# Altium footprint library Molex.PcbLib: 45 footprints (part 3 of 3)
Each footprint in its own frame and in the unit in brackets; x right, y up, seen from the top. Pads: shape width x height; smd on the part's side, far side on the other; paste and mask are expansions set on the pad; w line width, h text height; cw(c..) or ccw(c..) is an arc to the next point about the centre after c.
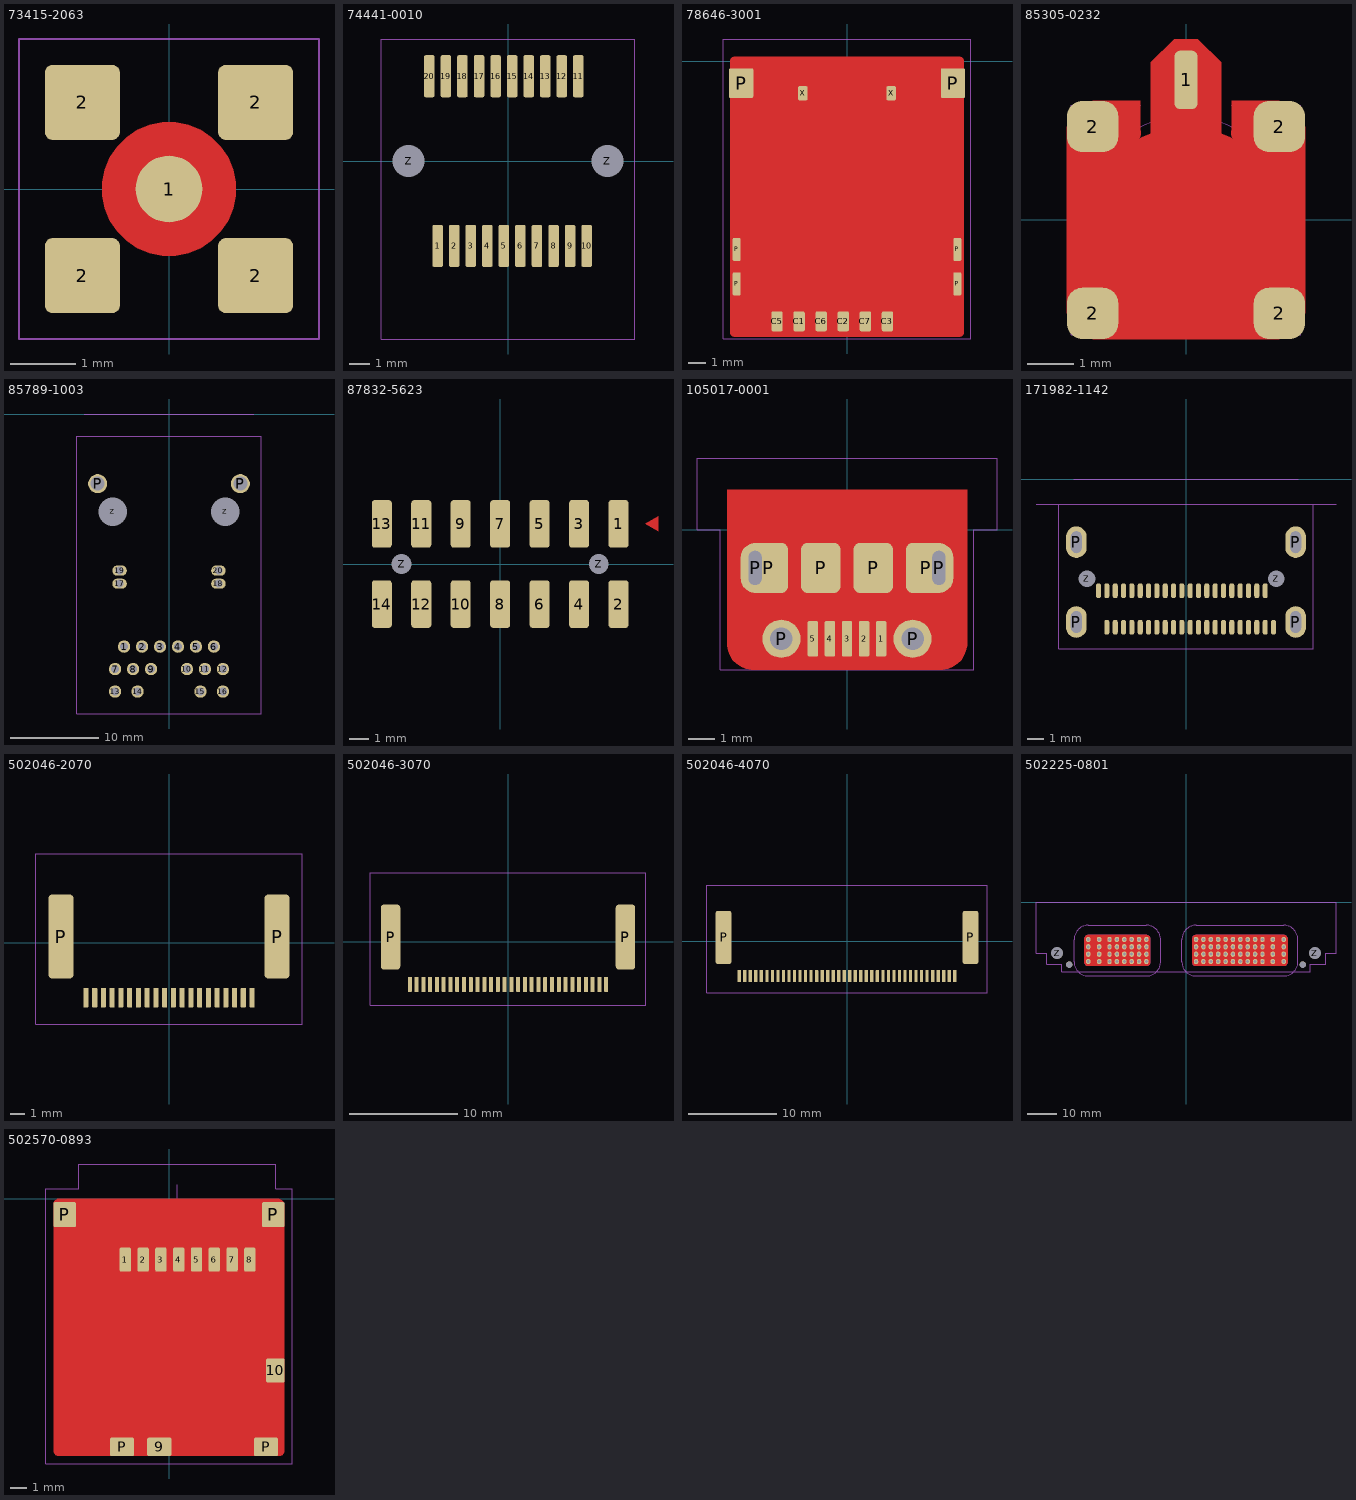
[diagram p2: the footprints below, top view; thin cyan lines are the x and y axes]

## 73415-2063 [mil]
pads (5):
  round 40 smd paste-1 mask+2: 1(0,0)
  rrect20% 45x45 smd paste-1 mask+2: 2(-52,-52) 2(-52,52) 2(52,-52) 2(52,52)
Top Layer:
  pour cut-out: 0,40 -3.94,40 -11.67,38.46 -18.95,35.45 -25.5,31.07 -31.07,25.5 -35.45,18.95 -38.46,11.67 -40,3.94 -40,0 -40,-3.94 -38.46,-11.67 -35.45,-18.95 -31.07,-25.5 -25.5,-31.07 -18.95,-35.45 -11.67,-38.46 -3.94,-40 0,-40 3.94,-40 11.67,-38.46 18.95,-35.45 25.5,-31.07 31.07,-25.5 35.45,-18.95 38.46,-11.67 40,-3.94 40,0 40,3.94 38.46,11.67 35.45,18.95 31.07,25.5 25.5,31.07 18.95,35.45 11.67,38.46 3.94,40
Top Component Outline:
  lines w1: -90,-90 -90,90 90,90 90,-90 -90,-90
Top 3D Body (Mech16):
  lines w1: -68,-68 -36,-68 -36,-36 -68,-36 -68,-68 ; -68,36 -68,68 -36,68 -36,36 -68,36 ; 36,-68 36,-36 68,-36 68,-68 36,-68 ; 36,36 36,68 68,68 68,36 36,36
3D body "MMCX.step": height 196.84, standoff -0.01, extent -68.89,-68.89 68.9,68.9

## 74441-0010 [mm] "SFP"
pads (22):
  rrect30% 0.508x2.032 smd paste+0 mask+0.051: 1(-3.4,-4.1) 2(-2.6,-4.1) 3(-1.8,-4.1) 4(-1,-4.1) 5(-0.2,-4.1) 6(0.6,-4.1) 7(1.4,-4.1) 8(2.2,-4.1) 9(3,-4.1) 10(3.8,-4.1) 11(3.4,4.1) 12(2.6,4.1) 13(1.8,4.1) 14(1,4.1) 15(0.2,4.1) 16(-0.6,4.1) 17(-1.4,4.1) 18(-2.2,4.1) 19(-3,4.1) 20(-3.8,4.1)
  round 0.635 hole 1.55 unplated mask+0.508: Z(-4.8,0) Z(4.8,0)
Top Component Outline:
  lines w0.025: -6.13,-8.6 6.13,-8.6 6.13,5.9 -6.13,5.9 -6.13,-8.6
Multi-Layer:
  pour cut-out: 4.8,1.016 4.9,1.016 5.096,0.977 5.281,0.9 5.448,0.789 5.589,0.648 5.7,0.481 5.777,0.296 5.816,0.1 5.816,0 5.816,-0.1 5.777,-0.296 5.7,-0.481 5.589,-0.648 5.448,-0.789 5.281,-0.9 5.096,-0.977 4.9,-1.016 4.8,-1.016 4.7,-1.016 4.504,-0.977 4.319,-0.9 4.152,-0.789 4.011,-0.648 3.9,-0.481 3.823,-0.296 3.784,-0.1 3.784,0 3.784,0.1 3.823,0.296 3.9,0.481 4.011,0.648 4.152,0.789 4.319,0.9 4.504,0.977 4.7,1.016
  pour cut-out: -4.8,1.016 -4.7,1.016 -4.504,0.977 -4.319,0.9 -4.152,0.789 -4.011,0.648 -3.9,0.481 -3.823,0.296 -3.784,0.1 -3.784,0 -3.784,-0.1 -3.823,-0.296 -3.9,-0.481 -4.011,-0.648 -4.152,-0.789 -4.319,-0.9 -4.504,-0.977 -4.7,-1.016 -4.8,-1.016 -4.9,-1.016 -5.096,-0.977 -5.281,-0.9 -5.448,-0.789 -5.589,-0.648 -5.7,-0.481 -5.777,-0.296 -5.816,-0.1 -5.816,0 -5.816,0.1 -5.777,0.296 -5.7,0.481 -5.589,0.648 -5.448,0.789 -5.281,0.9 -5.096,0.977 -4.9,1.016
3D body "744410010.stp": height 5.37, standoff -0.9, extent -5.5,-4.575 5.5,4.575

## 78646-3001 [mil]
pads (14):
  rrect30% 25.59x45.28 smd mask+2: C1(-108.46,-590) C2(-8.46,-590) C3(91.54,-590) C5(-158.46,-590) C6(-58.46,-590) C7(41.54,-590)
  rrect30% 18x52 smd mask+2: P(-250,-505) P(-250,-427) P(250,-505) P(250,-427)
  rrect10% 55x67 smd mask+2: P(-240,-50) P(240,-50)
  rrect30% 22x32 smd mask+2: X(-100,-73) X(100,-73)
Top Layer:
  pour cut-out: -255,10 -256.99,10 -260.66,8.48 -263.48,5.66 -265,1.99 -265,0 -265,-615 -265,-616.99 -263.48,-620.66 -260.66,-623.48 -256.99,-625 -255,-625 255,-625 256.99,-625 260.66,-623.48 263.48,-620.66 265,-616.99 265,-615 265,0 265,1.99 263.48,5.66 260.66,8.48 256.99,10 255,10
Top Component Outline:
  lines w1: -280,-630 280,-630 280,50 -280,50 -280,-630
3D body "78646-3001.stp": height 56.26, standoff -0.83, extent -256.89,-608.27 256.89,0

## 85305-0232 [mil]
pads (5):
  rrect50% 20x50 smd paste-1 mask+2: 1(0,120)
  rrect60% 44x44 smd paste-2 mask+2: 2(-80,-80) 2(-80,80) 2(80,-80) 2(80,80)
Top Layer:
  pour cut-out: -30,70 -30,135 -10,155 10,155 30,135 30,70
  pour cut-out: 0,-80 -7.88,-80 -23.34,-76.93 -37.89,-70.89 -51,-62.14 -62.14,-51 -70.89,-37.89 -76.93,-23.34 -80,-7.88 -80,0 -80,7.88 -76.93,23.34 -70.89,37.89 -62.14,51 -51,62.14 -37.89,70.89 -23.34,76.93 -7.88,80 0,80 7.88,80 23.34,76.93 37.89,70.89 51,62.14 62.14,51 70.89,37.89 76.93,23.34 80,7.88 80,0 80,-7.88 76.93,-23.34 70.89,-37.89 62.14,-51 51,-62.14 37.89,-70.89 23.34,-76.93 7.88,-80
  region: -80,102 -102,80 -102,-80 -80,-102 80,-102 102,-80 102,80 80,102 39,102 39,74 85,33 85,-35 35,-85 -38,-85 -85,-38 -85,33 -39,73 -39,102
  lines w19.68: -48.25,74.29 ccw(c0,0) 48.25,74.29
Top 3D Body (Mech16):
  circle w1: c0,0 r88.58
  lines w1: -39.37,98.43 -98.43,98.43 -98.43,-98.43 98.43,-98.43 98.43,98.43 39.37,98.43
3D body "853050232.stp": height 160, standoff -1.42, extent -98.42,-98.42 98.44,137.77

## 85789-1003 [mil] "POE RJ45"
pads (24):
  round 55 hole 35: 1(-200,-1035) 2(-120,-1035) 3(-40,-1035) 4(40,-1035) 5(120,-1035) 6(200,-1035) 7(-240,-1135) 8(-160,-1135) 9(-80,-1135) 10(80,-1135) 11(160,-1135) 12(240,-1135) 13(-240,-1235) 14(-140,-1235) 15(140,-1235) 16(240,-1235)
  oval 65x45 hole 35: 17(-220,-755) 18(220,-755) 19(-220,-697) 20(220,-697)
  round 85 hole 62: P(-317.5,-310) P(317.5,-310)
  round 39.37 hole 126 unplated mask+48: Z(-250,-435) Z(250,-435)
Top Component Outline:
  lines w1: -410,-1335 410,-1335 410,-100 -410,-100 -410,-1335
Top 3D Body (Mech16):
  lines w1: -377.69,0 377.69,0
Multi-Layer:
  pour cut-out: 250,-510 242.61,-510 228.12,-507.12 214.47,-501.46 202.19,-493.26 191.74,-482.81 183.54,-470.53 177.88,-456.88 175,-442.39 175,-435 175,-427.61 177.88,-413.12 183.54,-399.47 191.74,-387.19 202.19,-376.74 214.47,-368.54 228.12,-362.88 242.61,-360 250,-360 257.39,-360 271.88,-362.88 285.53,-368.54 297.81,-376.74 308.26,-387.19 316.46,-399.47 322.12,-413.12 325,-427.61 325,-435 325,-442.39 322.12,-456.88 316.46,-470.53 308.26,-482.81 297.81,-493.26 285.53,-501.46 271.88,-507.12 257.39,-510
  pour cut-out: -250,-510 -257.39,-510 -271.88,-507.12 -285.53,-501.46 -297.81,-493.26 -308.26,-482.81 -316.46,-470.53 -322.12,-456.88 -325,-442.39 -325,-435 -325,-427.61 -322.12,-413.12 -316.46,-399.47 -308.26,-387.19 -297.81,-376.74 -285.53,-368.54 -271.88,-362.88 -257.39,-360 -250,-360 -242.61,-360 -228.12,-362.88 -214.47,-368.54 -202.19,-376.74 -191.74,-387.19 -183.54,-399.47 -177.88,-413.12 -175,-427.61 -175,-435 -175,-442.39 -177.88,-456.88 -183.54,-470.53 -191.74,-482.81 -202.19,-493.26 -214.47,-501.46 -228.12,-507.12 -242.61,-510
3D body "MOLEX-SD-85789-1006.stp": height 593.98, standoff -144.06, extent -377.69,-1299.61 377.7,0

## 87832-5623 [mil]
pads (16):
  rrect30% 40x95 smd: 1(236.22,80) 2(236.22,-80) 3(157.48,80) 4(157.48,-80) 5(78.74,80) 6(78.74,-80) 7(0,80) 8(0,-80) 9(-78.74,80) 10(-78.74,-80) 11(-157.48,80) 12(-157.48,-80) 13(-236.22,80) 14(-236.22,-80)
  round 27 hole 39.37 unplated mask+10: Z(-196.85,0) Z(196.85,0)
Top Layer:
  region: 290,80 315,65 315,95
Multi-Layer:
  pour cut-out: 196.85,30 193.9,30 188.1,28.85 182.64,26.59 177.73,23.3 173.55,19.12 170.26,14.21 168,8.75 166.85,2.95 166.85,0 166.85,-2.95 168,-8.75 170.27,-14.21 173.55,-19.12 177.73,-23.3 182.64,-26.58 188.1,-28.85 193.9,-30 196.85,-30 199.81,-30 205.6,-28.85 211.06,-26.58 215.97,-23.3 220.15,-19.12 223.44,-14.21 225.7,-8.75 226.85,-2.95 226.85,0 226.85,2.95 225.7,8.75 223.44,14.21 220.15,19.12 215.97,23.3 211.06,26.59 205.6,28.85 199.8,30
  pour cut-out: -196.85,30 -199.81,30 -205.6,28.85 -211.06,26.59 -215.97,23.3 -220.15,19.12 -223.44,14.21 -225.7,8.75 -226.85,2.95 -226.85,0 -226.85,-2.95 -225.7,-8.75 -223.44,-14.21 -220.15,-19.12 -215.97,-23.3 -211.06,-26.58 -205.6,-28.85 -199.8,-30 -196.85,-30 -193.9,-30 -188.1,-28.85 -182.64,-26.58 -177.73,-23.3 -173.55,-19.12 -170.27,-14.21 -168,-8.75 -166.85,-2.95 -166.85,0 -166.85,2.95 -168,8.75 -170.27,14.21 -173.55,19.12 -177.73,23.3 -182.64,26.59 -188.1,28.85 -193.9,30
3D body "878325623.stp": height 356.3, standoff -29.53, extent -327.77,-125 327.75,124.99

## 105017-0001 [mm] "REC TYPE B ASSY MICRO USB"
pads (13):
  rrect30% 0.4x1.35 smd: 1(1.3,-4.15) 2(0.65,-4.15) 3(0,-4.15) 4(-0.65,-4.15) 5(-1.3,-4.15)
  oval 1.1x1.9 hole 0.5 slot 1.3 at 90 deg: P(-3.5,-1.45) P(3.5,-1.45)
  rrect30% 1.5x1.9 smd paste+0: P(-3,-1.45)
  round 1.45 hole 0.85: P(-2.5,-4.15) P(2.5,-4.15)
  rrect30% 1.5x1.9 smd: P(-1,-1.45) P(1,-1.45) P(3,-1.45)
Top Layer:
  pour cut-out: -4.572,1.524 -4.572,-4.318 -4.572,-4.418 -4.533,-4.614 -4.456,-4.799 -4.345,-4.966 -4.204,-5.107 -4.037,-5.218 -3.852,-5.295 -3.656,-5.334 -3.556,-5.334 3.556,-5.334 3.656,-5.334 3.852,-5.295 4.037,-5.218 4.204,-5.107 4.345,-4.966 4.456,-4.799 4.533,-4.614 4.572,-4.418 4.572,-4.318 4.572,1.524
Top Paste:
  region: -2.5,-3.439 -2.57,-3.439 -2.707,-3.466 -2.837,-3.52 -2.953,-3.598 -3.052,-3.697 -3.13,-3.813 -3.184,-3.943 -3.211,-4.08 -3.211,-4.15 -3.211,-4.22 -3.184,-4.357 -3.13,-4.487 -3.052,-4.603 -2.953,-4.702 -2.837,-4.78 -2.707,-4.834 -2.57,-4.861 -2.5,-4.861 -2.43,-4.861 -2.293,-4.834 -2.163,-4.78 -2.047,-4.702 -1.948,-4.603 -1.87,-4.487 -1.816,-4.357 -1.789,-4.22 -1.789,-4.15 -1.789,-4.08 -1.816,-3.943 -1.87,-3.813 -1.948,-3.697 -2.047,-3.598 -2.163,-3.52 -2.293,-3.466 -2.43,-3.439
  region: 2.5,-3.439 2.43,-3.439 2.293,-3.466 2.163,-3.52 2.047,-3.598 1.948,-3.697 1.87,-3.813 1.816,-3.943 1.789,-4.08 1.789,-4.15 1.789,-4.22 1.816,-4.357 1.87,-4.487 1.948,-4.603 2.047,-4.702 2.163,-4.78 2.293,-4.834 2.43,-4.861 2.5,-4.861 2.57,-4.861 2.707,-4.834 2.837,-4.78 2.953,-4.702 3.052,-4.603 3.13,-4.487 3.184,-4.357 3.211,-4.22 3.211,-4.15 3.211,-4.08 3.184,-3.943 3.13,-3.813 3.052,-3.697 2.953,-3.598 2.837,-3.52 2.707,-3.466 2.57,-3.439
  region: -3.5,-0.51 -3.606,-0.51 -3.802,-0.591 -3.952,-0.741 -4.033,-0.937 -4.033,-1.044 -4.033,-1.856 -4.033,-1.962 -3.952,-2.159 -3.802,-2.309 -3.606,-2.39 -3.5,-2.39 -3.394,-2.39 -3.198,-2.309 -3.048,-2.159 -2.967,-1.962 -2.967,-1.856 -2.967,-1.044 -2.967,-0.937 -3.048,-0.741 -3.198,-0.591 -3.394,-0.51
  region: 3.5,-0.51 3.394,-0.51 3.198,-0.591 3.048,-0.741 2.967,-0.937 2.967,-1.044 2.967,-1.856 2.967,-1.962 3.048,-2.159 3.198,-2.309 3.394,-2.39 3.5,-2.39 3.606,-2.39 3.802,-2.309 3.952,-2.159 4.033,-1.962 4.033,-1.856 4.033,-1.044 4.033,-0.937 3.952,-0.741 3.802,-0.591 3.606,-0.51
Top Component Outline:
  lines w0.025: -5.715,0 -5.715,2.732 5.715,2.732 5.715,0 4.826,0 4.826,-5.334 -4.826,-5.334 -4.826,0 -5.715,0
3D body "MOLEX-105017-0001.stp": height 2.65, standoff -0.65, extent -4.1,-4.3 4.1,1.1

## 171982-1142 [mm] "SFP"
pads (48):
  oval 0.31x0.899 smd paste+0 mask+0.051: A1(4.75,-6.685) A2(4.25,-6.685) A3(3.75,-6.685) A4(3.25,-6.685) A5(2.75,-6.685) A6(2.25,-6.685) A7(1.75,-6.685) A8(1.25,-6.685) A9(0.75,-6.685) A10(0.25,-6.685) A11(-0.25,-6.685) A12(-0.75,-6.685) A13(-1.25,-6.685) A14(-1.75,-6.685) A15(-2.25,-6.685) A16(-2.75,-6.685) A17(-3.25,-6.685) A18(-3.75,-6.685) A19(-4.25,-6.685) A20(-4.75,-6.685) A21(-5.25,-6.685) B1(5.25,-8.875) B2(4.75,-8.875) B3(4.25,-8.875) B4(3.75,-8.875) B5(3.25,-8.875) B6(2.75,-8.875) B7(2.25,-8.875) B8(1.75,-8.875) B9(1.25,-8.875) B10(0.75,-8.875) B11(0.25,-8.875) B12(-0.25,-8.875) B13(-0.75,-8.875) B14(-1.25,-8.875) B15(-1.75,-8.875) B16(-2.25,-8.875) B17(-2.75,-8.875) B18(-3.25,-8.875) B19(-3.75,-8.875) B20(-4.25,-8.875) B21(-4.75,-8.875)
  oval 1.24x1.9 hole 0.64 slot 1.3 at 90 deg: P(-6.58,-8.56) P(-6.58,-3.77) P(6.58,-8.56) P(6.58,-3.77)
  round 0.635 hole 1 unplated: Z(-5.94,-5.97) Z(5.41,-5.97)
Top Paste:
  region: -5.97,-8.89 -5.97,-9.011 -6.063,-9.236 -6.235,-9.407 -6.459,-9.5 -6.58,-9.5 -6.701,-9.5 -6.925,-9.407 -7.097,-9.236 -7.19,-9.011 -7.19,-8.89 -7.19,-8.23 -7.19,-8.109 -7.097,-7.884 -6.925,-7.713 -6.701,-7.62 -6.58,-7.62 -6.459,-7.62 -6.235,-7.713 -6.063,-7.884 -5.97,-8.109 -5.97,-8.23
  region: -5.97,-4.1 -5.97,-4.221 -6.063,-4.446 -6.235,-4.617 -6.459,-4.71 -6.58,-4.71 -6.701,-4.71 -6.925,-4.617 -7.097,-4.446 -7.19,-4.221 -7.19,-4.1 -7.19,-3.44 -7.19,-3.319 -7.097,-3.094 -6.925,-2.923 -6.701,-2.83 -6.58,-2.83 -6.459,-2.83 -6.235,-2.923 -6.063,-3.094 -5.97,-3.319 -5.97,-3.44
  region: 7.19,-8.89 7.19,-9.011 7.097,-9.236 6.925,-9.407 6.701,-9.5 6.58,-9.5 6.459,-9.5 6.235,-9.407 6.063,-9.236 5.97,-9.011 5.97,-8.89 5.97,-8.23 5.97,-8.109 6.063,-7.884 6.235,-7.713 6.459,-7.62 6.58,-7.62 6.701,-7.62 6.925,-7.713 7.097,-7.884 7.19,-8.109 7.19,-8.23
  region: 7.19,-4.1 7.19,-4.221 7.097,-4.446 6.925,-4.617 6.701,-4.71 6.58,-4.71 6.459,-4.71 6.235,-4.617 6.063,-4.446 5.97,-4.221 5.97,-4.1 5.97,-3.44 5.97,-3.319 6.063,-3.094 6.235,-2.923 6.459,-2.83 6.58,-2.83 6.701,-2.83 6.925,-2.923 7.097,-3.094 7.19,-3.319 7.19,-3.44
Top Component Outline:
  lines w0.025: -9,-1.51 9,-1.51 ; -7.62,-1.524 -7.62,-10.16 7.62,-10.16 7.62,-1.524
Top 3D Body (Mech16):
  lines w0.025: -6.725,0 6.725,0
3D body "MOLEX-171982-1142.stp": height 3.88, standoff -3.02, extent -6.725,-9.176 6.725,0

## 502046-2070 [mm] "SFP"
pads (22):
  rrect30% 0.37x1.4 smd paste+0 mask+0.051: 1(-5.937,-3.937) 2(-5.312,-3.937) 3(-4.687,-3.937) 4(-4.062,-3.937) 5(-3.437,-3.937) 6(-2.812,-3.937) 7(-2.187,-3.937) 8(-1.562,-3.937) 9(-0.937,-3.937) 10(-0.312,-3.937) 11(0.313,-3.937) 12(0.938,-3.937) 13(1.563,-3.937) 14(2.188,-3.937) 15(2.813,-3.937) 16(3.437,-3.937) 17(4.062,-3.937) 18(4.687,-3.937) 19(5.312,-3.937) 20(5.937,-3.937)
  rrect30% 1.8x6 smd paste-0.254 mask+0.051: P(-7.721,0.432) P(7.721,0.432)
Top Component Outline:
  lines w0.025: -9.525,-5.842 9.525,-5.842 9.525,6.35 -9.525,6.35 -9.525,-5.842
3D body "MOLEX-502046-2070.stp": height 7.52, standoff 0.02, extent -8.275,-4.4 8.275,4.4

## 502046-3070 [mm] "SFP"
pads (32):
  rrect30% 0.37x1.4 smd paste+0 mask+0.051: 1(-9.062,-3.937) 2(-8.437,-3.937) 3(-7.812,-3.937) 4(-7.187,-3.937) 5(-6.562,-3.937) 6(-5.937,-3.937) 7(-5.312,-3.937) 8(-4.687,-3.937) 9(-4.062,-3.937) 10(-3.437,-3.937) 11(-2.812,-3.937) 12(-2.187,-3.937) 13(-1.562,-3.937) 14(-0.937,-3.937) 15(-0.312,-3.937) 16(0.312,-3.937) 17(0.937,-3.937) 18(1.562,-3.937) 19(2.187,-3.937) 20(2.812,-3.937) 21(3.437,-3.937) 22(4.062,-3.937) 23(4.687,-3.937) 24(5.312,-3.937) 25(5.937,-3.937) 26(6.562,-3.937) 27(7.187,-3.937) 28(7.812,-3.937) 29(8.437,-3.937) 30(9.062,-3.937)
  rrect30% 1.8x6 smd paste-0.254 mask+0.051: P(-10.846,0.432) P(10.846,0.432)
Top Component Outline:
  lines w0.025: -12.7,-5.842 12.7,-5.842 12.7,6.35 -12.7,6.35 -12.7,-5.842
3D body "MOLEX-502046-3070.stp": height 7.52, standoff 0.02, extent -11.4,-4.4 11.4,4.4

## 502046-4070 [mm] "SFP"
pads (42):
  rrect30% 0.37x1.4 smd paste+0 mask+0.051: 1(-12.187,-3.937) 2(-11.562,-3.937) 3(-10.937,-3.937) 4(-10.312,-3.937) 5(-9.687,-3.937) 6(-9.062,-3.937) 7(-8.437,-3.937) 8(-7.812,-3.937) 9(-7.187,-3.937) 10(-6.562,-3.937) 11(-5.937,-3.937) 12(-5.312,-3.937) 13(-4.687,-3.937) 14(-4.062,-3.937) 15(-3.437,-3.937) 16(-2.813,-3.937) 17(-2.188,-3.937) 18(-1.563,-3.937) 19(-0.938,-3.937) 20(-0.313,-3.937) 21(0.312,-3.937) 22(0.937,-3.937) 23(1.562,-3.937) 24(2.187,-3.937) 25(2.812,-3.937) 26(3.437,-3.937) 27(4.062,-3.937) 28(4.687,-3.937) 29(5.312,-3.937) 30(5.937,-3.937) 31(6.562,-3.937) 32(7.187,-3.937) 33(7.812,-3.937) 34(8.437,-3.937) 35(9.062,-3.937) 36(9.687,-3.937) 37(10.312,-3.937) 38(10.937,-3.937) 39(11.562,-3.937) 40(12.187,-3.937)
  rrect30% 1.8x6 smd paste-0.254 mask+0.051: P(-13.971,0.432) P(13.971,0.432)
Top Component Outline:
  lines w0.025: -15.875,-5.842 -15.875,6.35 15.875,6.35 15.875,-5.842 -15.875,-5.842
3D body "MOLEX-502046-4070.stp": height 7.52, standoff 0.02, extent -14.525,-4.4 14.525,4.4

## 502225-0801 [mm]
pads (84):
  oval 1.5x1.8 hole 1: AA1(3.4,-12.65) AA2(3.4,-15.15) AA3(3.4,-17.65) AA4(3.4,-20.15) AB1(5.9,-12.65) AB2(5.9,-15.15) AB3(5.9,-17.65) AB4(5.9,-20.15) AC1(8.4,-12.65) AC2(8.4,-15.15) AC3(8.4,-17.65) AC4(8.4,-20.15) AD1(10.9,-12.65) AD2(10.9,-15.15) AD3(10.9,-17.65) AD4(10.9,-20.15) AE1(13.4,-12.65) AE2(13.4,-15.15) AE3(13.4,-17.65) AE4(13.4,-20.15) AF1(15.9,-12.65) AF2(15.9,-15.15) AF3(15.9,-17.65) AF4(15.9,-20.15) AG1(18.4,-12.65) AG2(18.4,-15.15) AG3(18.4,-17.65) AG4(18.4,-20.15) AH1(20.9,-12.65) AH2(20.9,-15.15) AH3(20.9,-17.65) AH4(20.9,-20.15) AJ1(23.4,-12.65) AJ2(23.4,-15.15) AJ3(23.4,-17.65) AJ4(23.4,-20.15) AK1(25.9,-12.65) AK2(25.9,-15.15) AK3(25.9,-17.65) AK4(25.9,-20.15) AL1(29.4,-12.65) AL2(29.4,-15.15) AL3(29.4,-17.65) AL4(29.4,-20.15) AM1(33.1,-12.65) AM2(33.1,-15.15) AM3(33.1,-17.65) AM4(33.1,-20.15) BA1(-13.4,-20.15) BA2(-13.4,-17.65) BA3(-13.4,-15.15) BA4(-13.4,-12.65) BB1(-15.9,-20.15) BB2(-15.9,-17.65) BB3(-15.9,-15.15) BB4(-15.9,-12.65) BC1(-18.4,-20.15) BC2(-18.4,-17.65) BC3(-18.4,-15.15) BC4(-18.4,-12.65) BD1(-20.9,-20.15) BD2(-20.9,-17.65) BD3(-20.9,-15.15) BD4(-20.9,-12.65) BE1(-23.4,-20.15) BE2(-23.4,-17.65) BE3(-23.4,-15.15) BE4(-23.4,-12.65) BF1(-25.9,-20.15) BF2(-25.9,-17.65) BF3(-25.9,-15.15) BF4(-25.9,-12.65) BG1(-29.4,-20.15) BG2(-29.4,-17.65) BG3(-29.4,-15.15) BG4(-29.4,-12.65) BH1(-33.1,-20.15) BH2(-33.1,-17.65) BH3(-33.1,-15.15) BH4(-33.1,-12.65)
  round 3.9 hole 4 unplated mask+0.203: Z(-43.65,-17.3) Z(43.65,-17.3)
  round 2.1 hole 2.2 unplated mask+0.203: Z(-39.55,-21.15) Z(39.55,-21.15)
Top Layer:
  pour cut-out: -13.4,-21.65 -13.267,-21.65 -13.006,-21.598 -12.761,-21.496 -12.539,-21.349 -12.351,-21.161 -12.204,-20.939 -12.102,-20.694 -12.05,-20.433 -12.05,-20.3 -12.05,-12.5 -12.05,-12.367 -12.102,-12.106 -12.204,-11.861 -12.351,-11.639 -12.539,-11.451 -12.761,-11.304 -13.006,-11.202 -13.267,-11.15 -13.4,-11.15 -33.1,-11.15 -33.233,-11.15 -33.494,-11.202 -33.739,-11.304 -33.961,-11.451 -34.149,-11.639 -34.296,-11.861 -34.398,-12.106 -34.45,-12.367 -34.45,-12.5 -34.45,-20.3 -34.45,-20.433 -34.398,-20.694 -34.296,-20.939 -34.149,-21.161 -33.961,-21.349 -33.739,-21.496 -33.494,-21.598 -33.233,-21.65 -33.1,-21.65
  pour cut-out: 33.1,-21.65 33.233,-21.65 33.494,-21.598 33.739,-21.496 33.961,-21.349 34.149,-21.161 34.296,-20.939 34.398,-20.694 34.45,-20.433 34.45,-20.3 34.45,-12.5 34.45,-12.367 34.398,-12.106 34.296,-11.861 34.149,-11.639 33.961,-11.451 33.739,-11.304 33.494,-11.202 33.233,-11.15 33.1,-11.15 3.4,-11.15 3.267,-11.15 3.006,-11.202 2.761,-11.304 2.539,-11.451 2.351,-11.639 2.204,-11.861 2.102,-12.106 2.05,-12.367 2.05,-12.5 2.05,-20.3 2.05,-20.433 2.102,-20.694 2.204,-20.939 2.351,-21.161 2.539,-21.349 2.761,-21.496 3.006,-21.598 3.267,-21.65 3.4,-21.65
Bottom Layer:
  pour cut-out: 33.1,-21.65 33.233,-21.65 33.494,-21.598 33.739,-21.496 33.961,-21.349 34.149,-21.161 34.296,-20.939 34.398,-20.694 34.45,-20.433 34.45,-20.3 34.45,-12.5 34.45,-12.367 34.398,-12.106 34.296,-11.861 34.149,-11.639 33.961,-11.451 33.739,-11.304 33.494,-11.202 33.233,-11.15 33.1,-11.15 3.4,-11.15 3.267,-11.15 3.006,-11.202 2.761,-11.304 2.539,-11.451 2.351,-11.639 2.204,-11.861 2.102,-12.106 2.05,-12.367 2.05,-12.5 2.05,-20.3 2.05,-20.433 2.102,-20.694 2.204,-20.939 2.351,-21.161 2.539,-21.349 2.761,-21.496 3.006,-21.598 3.267,-21.65 3.4,-21.65
  pour cut-out: -13.4,-21.65 -13.267,-21.65 -13.006,-21.598 -12.761,-21.496 -12.539,-21.349 -12.351,-21.161 -12.204,-20.939 -12.102,-20.694 -12.05,-20.433 -12.05,-20.3 -12.05,-12.5 -12.05,-12.367 -12.102,-12.106 -12.204,-11.861 -12.351,-11.639 -12.539,-11.451 -12.761,-11.304 -13.006,-11.202 -13.267,-11.15 -13.4,-11.15 -33.1,-11.15 -33.233,-11.15 -33.494,-11.202 -33.739,-11.304 -33.961,-11.451 -34.149,-11.639 -34.296,-11.861 -34.398,-12.106 -34.45,-12.367 -34.45,-12.5 -34.45,-20.3 -34.45,-20.433 -34.398,-20.694 -34.296,-20.939 -34.149,-21.161 -33.961,-21.349 -33.739,-21.496 -33.494,-21.598 -33.233,-21.65 -33.1,-21.65
Top Component Outline:
  lines w0.025: -50.8,-17.272 -47.244,-17.272 -47.244,-21.082 -42.037,-21.082 -42.037,-23.622 42.037,-23.622 42.037,-21.082 47.244,-21.082 47.244,-17.272 50.8,-17.272 50.8,0 -50.8,0 -50.8,-17.272 ; -37.897,-20.193 ccw(c-33.071,-20.193) -33.071,-25.019 -13.429,-25.019 ccw(c-13.429,-20.193) -8.603,-20.193 -8.603,-12.7 ccw(c-13.429,-12.7) -13.429,-7.874 -33.071,-7.874 ccw(c-33.071,-12.7) -37.897,-12.7 -37.897,-20.193 ; -1.397,-20.193 ccw(c3.429,-20.193) 3.429,-25.019 33.071,-25.019 ccw(c33.071,-20.193) 37.897,-20.193 37.897,-12.7 ccw(c33.071,-12.7) 33.071,-7.874 3.429,-7.874 ccw(c3.429,-12.7) -1.397,-12.7 -1.397,-20.193
Multi-Layer:
  pour cut-out: 43.65,-19.8 43.896,-19.8 44.379,-19.704 44.834,-19.515 45.244,-19.242 45.592,-18.894 45.865,-18.484 46.054,-18.029 46.15,-17.546 46.15,-17.3 46.15,-17.054 46.054,-16.571 45.865,-16.116 45.592,-15.706 45.244,-15.358 44.834,-15.085 44.379,-14.896 43.896,-14.8 43.65,-14.8 43.404,-14.8 42.921,-14.896 42.466,-15.085 42.056,-15.358 41.708,-15.706 41.435,-16.116 41.246,-16.571 41.15,-17.054 41.15,-17.3 41.15,-17.546 41.246,-18.029 41.435,-18.484 41.708,-18.894 42.056,-19.242 42.466,-19.515 42.921,-19.704 43.404,-19.8
  pour cut-out: 39.55,-22.65 39.698,-22.65 39.988,-22.592 40.261,-22.479 40.506,-22.315 40.715,-22.106 40.879,-21.861 40.992,-21.588 41.05,-21.298 41.05,-21.15 41.05,-21.002 40.992,-20.712 40.879,-20.439 40.715,-20.194 40.506,-19.985 40.261,-19.821 39.988,-19.708 39.698,-19.65 39.55,-19.65 39.402,-19.65 39.112,-19.708 38.839,-19.821 38.594,-19.985 38.385,-20.194 38.221,-20.439 38.108,-20.712 38.05,-21.002 38.05,-21.15 38.05,-21.298 38.108,-21.588 38.221,-21.861 38.385,-22.106 38.594,-22.315 38.839,-22.479 39.112,-22.592 39.402,-22.65
  pour cut-out: -39.55,-22.65 -39.698,-22.65 -39.988,-22.592 -40.261,-22.479 -40.506,-22.315 -40.715,-22.106 -40.879,-21.861 -40.992,-21.588 -41.05,-21.298 -41.05,-21.15 -41.05,-21.002 -40.992,-20.712 -40.879,-20.439 -40.715,-20.194 -40.506,-19.985 -40.261,-19.821 -39.988,-19.708 -39.698,-19.65 -39.55,-19.65 -39.402,-19.65 -39.112,-19.708 -38.839,-19.821 -38.594,-19.985 -38.385,-20.194 -38.221,-20.439 -38.108,-20.712 -38.05,-21.002 -38.05,-21.15 -38.05,-21.298 -38.108,-21.588 -38.221,-21.861 -38.385,-22.106 -38.594,-22.315 -38.839,-22.479 -39.112,-22.592 -39.402,-22.65
  pour cut-out: -43.65,-19.8 -43.404,-19.8 -42.921,-19.704 -42.466,-19.515 -42.056,-19.242 -41.708,-18.894 -41.435,-18.484 -41.246,-18.029 -41.15,-17.546 -41.15,-17.3 -41.15,-17.054 -41.246,-16.571 -41.435,-16.116 -41.708,-15.706 -42.056,-15.358 -42.466,-15.085 -42.921,-14.896 -43.404,-14.8 -43.65,-14.8 -43.896,-14.8 -44.379,-14.896 -44.834,-15.085 -45.244,-15.358 -45.592,-15.706 -45.865,-16.116 -46.054,-16.571 -46.15,-17.054 -46.15,-17.3 -46.15,-17.546 -46.054,-18.029 -45.865,-18.484 -45.592,-18.894 -45.244,-19.242 -44.834,-19.515 -44.379,-19.704 -43.896,-19.8
3D body "MOLEX-502225-0801.stp": height 27.27, standoff -5.88, extent -49.5,-22.15 49.5,26.85

## 502570-0893 [mm] "MICROSD MEMORY CARD Socket"
height 1.956
pads (14):
  rrect30% 0.7x1.5 smd: 1(-2.7,-3.75) 2(-1.6,-3.75) 3(-0.5,-3.75) 4(0.6,-3.75) 5(1.7,-3.75) 6(2.8,-3.75) 7(3.9,-3.75) 8(5,-3.75)
  rrect20% 1.5x1.15 smd paste-0.051: 9(-0.6,-15.325) P(-2.9,-15.325) P(6,-15.325)
  rrect20% 1.15x1.5 smd paste-0.051: 10(6.575,-10.6)
  rrect10% 1.4x1.524 smd paste-0.051: P(-6.45,-0.965) P(6.45,-0.965)
Top Layer:
  pour cut-out: -6.858,0 -6.909,0 -7.002,-0.039 -7.073,-0.11 -7.112,-0.203 -7.112,-0.254 -7.112,-15.621 -7.112,-15.672 -7.073,-15.765 -7.002,-15.836 -6.909,-15.875 -6.858,-15.875 6.858,-15.875 6.909,-15.875 7.002,-15.836 7.073,-15.765 7.112,-15.672 7.112,-15.621 7.112,-0.381 7.112,-0.305 7.054,-0.165 6.947,-0.058 6.807,0 6.731,0
Top Component Outline:
  lines w0.025: -7.62,-16.383 7.62,-16.383 7.62,0.635 6.604,0.635 6.604,2.159 -5.588,2.159 -5.588,0.635 -7.62,0.635 -7.62,-16.383
Top 3D Body (Mech16):
  lines w0.025: 0.5,-0.152 0.5,0.889
3D body "MicroSD.STP": height 1.75, standoff 0.77, extent -4.992,-13.452 6.008,1.548
3D body "MOLEX-502570-0893.stp": height 1.79, standoff -0.01, extent -6.9,-15.652 6.9,-0.152